# Altium footprint library PCB.PcbLib: 42 footprints (part 2 of 3)
Each footprint in its own frame and in the unit in brackets; x right, y up, seen from the top. Pads: shape width x height; smd on the part's side, far side on the other; paste and mask are expansions set on the pad; w line width, h text height; cw(c..) or ccw(c..) is an arc to the next point about the centre after c.
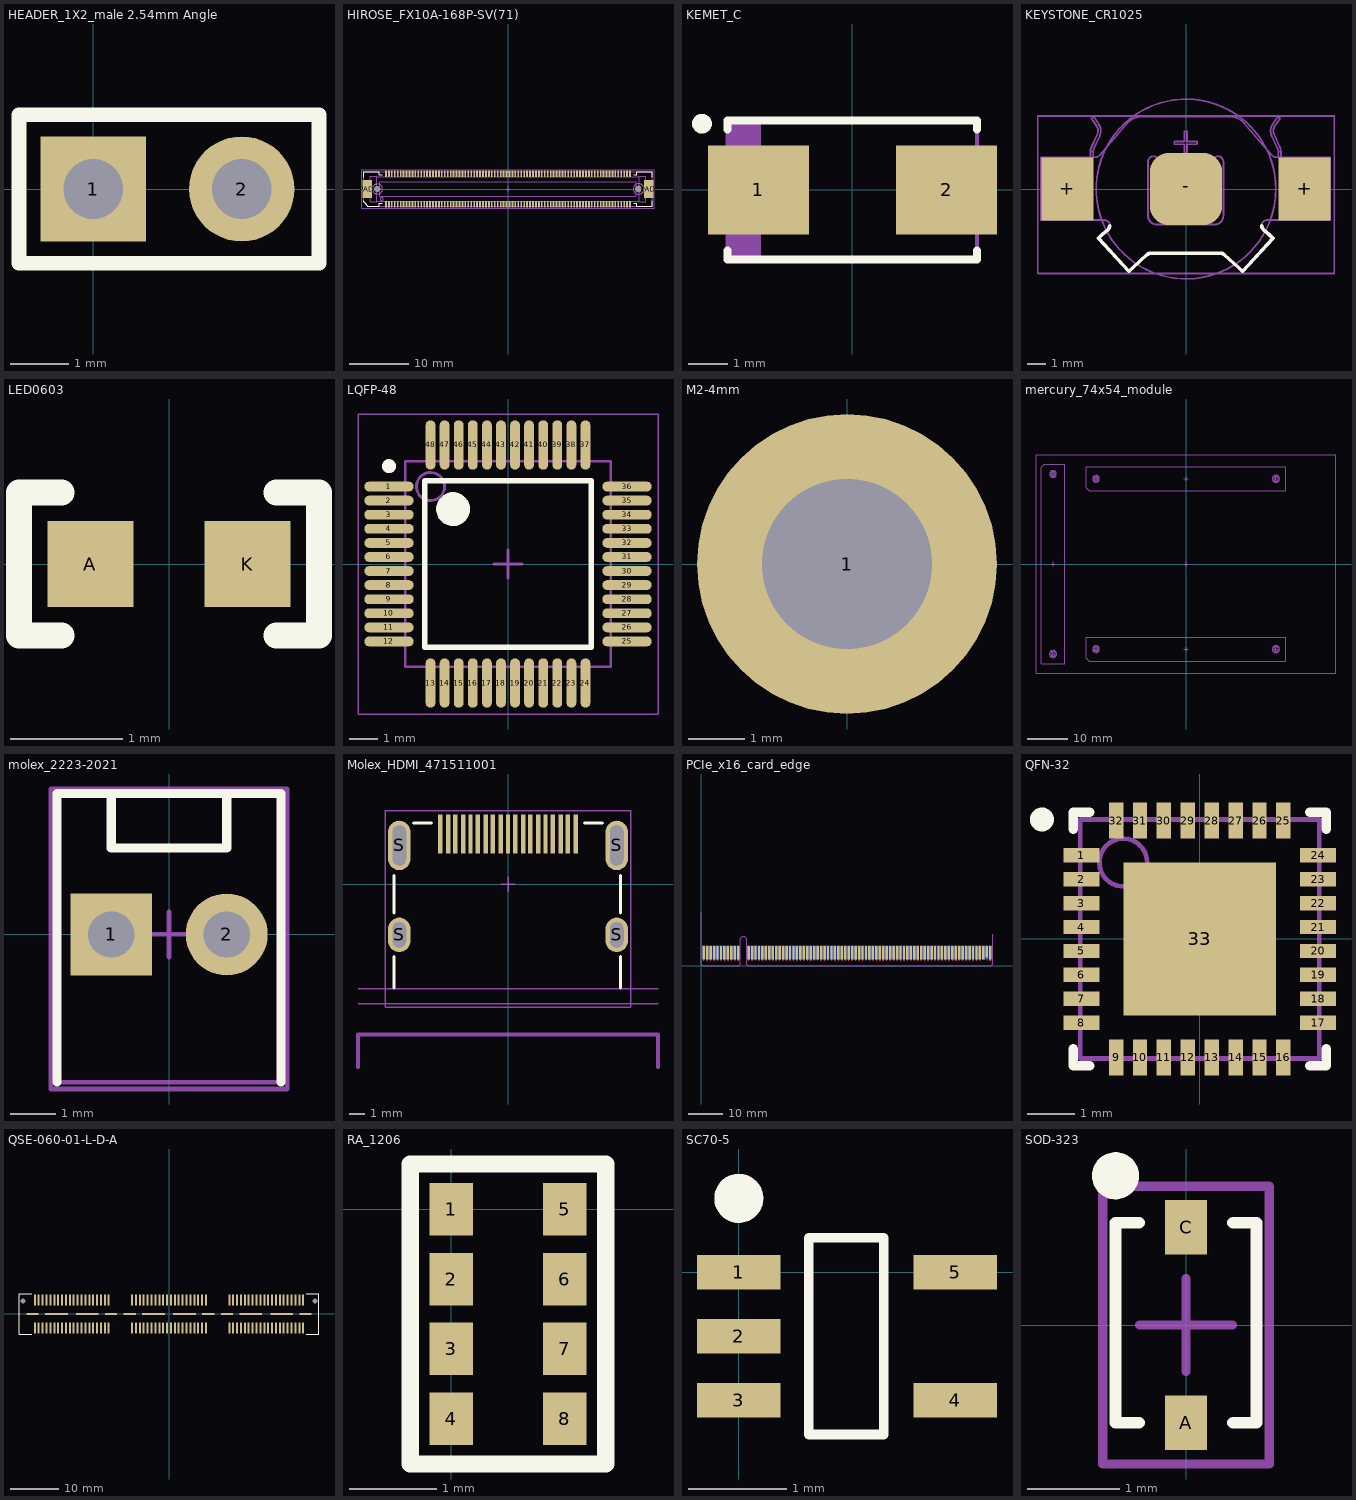
[diagram p1: the footprints below, top view; thin cyan lines are the x and y axes]

## HEADER_1X2_male 2.54mm Angle [mm] "Pinhead male 1x2 pitch 2.54mm angle"
pads (2):
  rect 1.8x1.8 hole 1.02: 1(0,0)
  round 1.8 hole 1.02: 2(2.54,0)
Top Overlay:
  lines w0.254: -1.27,-1.27 3.86,-1.27 3.86,1.27 -1.27,1.27 -1.27,-1.27
3D body: height 2.13, standoff -2.77, extent -1.17,-0.32 3.71,10.82

## HIROSE_FX10A-168P-SV(71) [mm] "Mercury FPGA baseboard header - 168pins - 4mm mating height"
height 4
pads (172):
  rect 0.3x1.1 smd: 1(-20.75,-2.6)
  rrect50% 0.3x1.1 smd: 2(-20.75,2.6) 3(-20.25,-2.6) 4(-20.25,2.6) 5(-19.75,-2.6) 6(-19.75,2.6) 7(-19.25,-2.6) 8(-19.25,2.6) 9(-18.75,-2.6) 10(-18.75,2.6) 11(-18.25,-2.6) 12(-18.25,2.6) 13(-17.75,-2.6) 14(-17.75,2.6) 15(-17.25,-2.6) 16(-17.25,2.6) 17(-16.75,-2.6) 18(-16.75,2.6) 19(-16.25,-2.6) 20(-16.25,2.6) 21(-15.75,-2.6) 22(-15.75,2.6) 23(-15.25,-2.6) 24(-15.25,2.6) 25(-14.75,-2.6) 26(-14.75,2.6) 27(-14.25,-2.6) 28(-14.25,2.6) 29(-13.75,-2.6) 30(-13.75,2.6) 31(-13.25,-2.6) 32(-13.25,2.6) 33(-12.75,-2.6) 34(-12.75,2.6) 35(-12.25,-2.6) 36(-12.25,2.6) 37(-11.75,-2.6) 38(-11.75,2.6) 39(-11.25,-2.6) 40(-11.25,2.6) 41(-10.75,-2.6) 42(-10.75,2.6) 43(-10.25,-2.6) 44(-10.25,2.6) 45(-9.75,-2.6) 46(-9.75,2.6) 47(-9.25,-2.6) 48(-9.25,2.6) 49(-8.75,-2.6) 50(-8.75,2.6) 51(-8.25,-2.6) 52(-8.25,2.6) 53(-7.75,-2.6) 54(-7.75,2.6) 55(-7.25,-2.6) 56(-7.25,2.6) 57(-6.75,-2.6) 58(-6.75,2.6) 59(-6.25,-2.6) 60(-6.25,2.6) 61(-5.75,-2.6) 62(-5.75,2.6) 63(-5.25,-2.6) 64(-5.25,2.6) 65(-4.75,-2.6) 66(-4.75,2.6) 67(-4.25,-2.6) 68(-4.25,2.6) 69(-3.75,-2.6) 70(-3.75,2.6) 71(-3.25,-2.6) 72(-3.25,2.6) 73(-2.75,-2.6) 74(-2.75,2.6) 75(-2.25,-2.6) 76(-2.25,2.6) 77(-1.75,-2.6) 78(-1.75,2.6) 79(-1.25,-2.6) 80(-1.25,2.6) 81(-0.75,-2.6) 82(-0.75,2.6) 83(-0.25,-2.6) 84(-0.25,2.6) 85(0.25,-2.6) 86(0.25,2.6) 87(0.75,-2.6) 88(0.75,2.6) 89(1.25,-2.6) 90(1.25,2.6) 91(1.75,-2.6) 92(1.75,2.6) 93(2.25,-2.6) 94(2.25,2.6) 95(2.75,-2.6) 96(2.75,2.6) 97(3.25,-2.6) 98(3.25,2.6) 99(3.75,-2.6) 100(3.75,2.6) 101(4.25,-2.6) 102(4.25,2.6) 103(4.75,-2.6) 104(4.75,2.6) 105(5.25,-2.6) 106(5.25,2.6) 107(5.75,-2.6) 108(5.75,2.6) 109(6.25,-2.6) 110(6.25,2.6) 111(6.75,-2.6) 112(6.75,2.6) 113(7.25,-2.6) 114(7.25,2.6) 115(7.75,-2.6) 116(7.75,2.6) 117(8.25,-2.6) 118(8.25,2.6) 119(8.75,-2.6) 120(8.75,2.6) 121(9.25,-2.6) 122(9.25,2.6) 123(9.75,-2.6) 124(9.75,2.6) 125(10.25,-2.6) 126(10.25,2.6) 127(10.75,-2.6) 128(10.75,2.6) 129(11.25,-2.6) 130(11.25,2.6) 131(11.75,-2.6) 132(11.75,2.6) 133(12.25,-2.6) 134(12.25,2.6) 135(12.75,-2.6) 136(12.75,2.6) 137(13.25,-2.6) 138(13.25,2.6) 139(13.75,-2.6) 140(13.75,2.6) 141(14.25,-2.6) 142(14.25,2.6) 143(14.75,-2.6) 144(14.75,2.6) 145(15.25,-2.6) 146(15.25,2.6) 147(15.75,-2.6) 148(15.75,2.6) 149(16.25,-2.6) 150(16.25,2.6) 151(16.75,-2.6) 152(16.75,2.6) 153(17.25,-2.6) 154(17.25,2.6) 155(17.75,-2.6) 156(17.75,2.6) 157(18.25,-2.6) 158(18.25,2.6) 159(18.75,-2.6) 160(18.75,2.6) 161(19.25,-2.6) 162(19.25,2.6) 163(19.75,-2.6) 164(19.75,2.6) 165(20.25,-2.6) 166(20.25,2.6) 167(20.75,-2.6) 168(20.75,2.6)
  round 0 hole 1.1 unplated: MTH(-22.2,0)
  round 0 hole 1.2 unplated: MTH(22.2,0)
  rect 1.6x3.1 smd: PAD(-23.95,0) PAD(23.95,0)
Top Overlay:
  lines w0.1: -21.35,-2.4 -21.9,-2.4 -21.9,-2.95 ; -21.35,2.4 -21.9,2.4 -21.9,2.95 -24.55,2.95 -24.55,2 ; 21.35,-2.4 21.9,-2.4 21.9,-2.95 ; 21.35,2.4 21.9,2.4 ; -24.55,-2 -24.55,-2.207 -23.807,-2.95 -21.9,-2.95 ; -24.55,-2 -24.55,-2 ; -24.55,2 -24.55,2 ; -21.9,-2.95 -21.9,-2.95 ; 21.9,-2.95 21.9,-2.95 ; 21.9,-2.95 24.55,-2.95 24.55,-2 ; 21.9,2.4 21.9,2.4 ; 21.9,2.4 21.9,2.95 ; 21.9,2.95 21.9,2.95 ; 21.9,2.95 24.55,2.95 24.55,2 ; 24.55,-2 24.55,-2 ; 24.55,2 24.55,2
Keep-Out Layer:
  circle w0.01: c-22.2,0 r0.85
  circle w0.01: c22.2,0 r0.9
Mechanical 12:
  circle w0.1: c-21.486,-1.7 r0.26
  circle w0.1: c-22.2,0 r0.85
  circle w0.1: c22.2,0 r0.9
  lines w0.05: -0.5,0 0.5,0 ; 0,-0.5 0,0.5
  lines w0.1: -22.3,-2.1 22.3,-2.1 ; -22.3,2.1 22.3,2.1 ; 24.55,-2.95 24.55,-2.95 ; 24.55,-2.95 -23.807,-2.95 -24.55,-2.207 -24.55,2.95 24.55,2.95 ; 24.55,-2.95 24.55,2.95 ; 24.55,2.95 24.55,2.95 ; -23.437,-2.187 -23.437,2.15 -22.3,2.15 -22.3,-2.187 -23.437,-2.187 ; -21.8,-1.26 21.8,-1.26 21.8,1.26 -21.8,1.26 -21.8,-1.26 ; 22.3,-2.15 23.42,-2.15 23.42,2.171 22.3,2.171 22.3,-2.15
  text ".Designator" at 1,0 h0.76
Mechanical 15:
  lines w0.02: -24.9,-3.3 -24.9,3.3 24.9,3.3 24.9,-3.3 -24.9,-3.3
3D body: height 3.51, standoff -0.59, extent -24.55,-2.95 24.55,2.95

## KEMET_C [mm] "Kemet type C package"
height 2.8
pads (2):
  rect 2.55x2.25 smd: 1(-2.375,0) 2(2.375,0)
Top Overlay:
  circle w0.25: c-3.8,1.675 r0.125
  lines w0.2: -3.15,-1.525 -3.15,-1.75 3.15,-1.75 3.15,-1.525 ; -3.15,1.525 -3.15,1.75 3.15,1.75 3.15,1.525
Mechanical 3:
  rectangle: -3.15,-1.75 -2.303,1.75
  lines w0.1: -3.15,-1.75 3.15,-1.75 3.15,1.75 -3.15,1.75 -3.15,-1.75
3D body: height 2.85, standoff 0, extent -3.023,-1.626 -2.286,1.651
3D body: height 2.8, standoff 0, extent -3.15,-1.75 3.15,1.75

## KEYSTONE_CR1025 [mm]
pads (3):
  rect 2.9x3.5 smd: +(-6.6,0) +(6.6,0)
  rrect50% 4x4 smd: -(0,0)
Top Overlay:
  lines w0.2: -4.246,-2.056 -4.248,-2.069 -4.251,-2.083 -4.255,-2.096 -4.259,-2.109 -4.263,-2.122 -4.268,-2.135 -4.273,-2.149 -4.279,-2.162 -4.284,-2.175 -4.289,-2.188 -4.337,-2.251 -4.655,-2.537 -4.877,-2.744 -3.189,-4.585 -2.961,-4.384 -2.178,-3.659 -2.115,-3.617 -2.046,-3.59 -1.972,-3.58 1.939,-3.58 2.013,-3.59 2.082,-3.617 2.14,-3.659 2.928,-4.384 3.156,-4.585 4.844,-2.744 4.622,-2.537 4.304,-2.251 4.257,-2.188 4.251,-2.175 4.245,-2.162 4.24,-2.149 4.235,-2.135 4.23,-2.122 4.225,-2.109 4.221,-2.096 4.217,-2.082 4.214,-2.069 4.211,-2.056
Mechanical 13:
  drawing of 624 lines, arcs and shapes, not listed
Mechanical 15:
  lines w0.1: -0.5,0 0.5,0 ; 0,-0.5 0,0.5 ; -8.255,-4.699 -8.255,4.064 -8.128,4.064 8.255,4.064 8.255,-4.699 -8.255,-4.699
Mechanical 16:
  circle w0.1: c0,0 r5
Mechanical 17:
  text "Battery insert" at -6.5,6 h1
3D body: height 2.95, standoff 0, extent -8.052,-4.608 8.053,4

## LED0603 [mil]
pads (2):
  rect 30x30 smd: A(-27.5,0) K(27.5,0)
Top Overlay:
  lines w9: -37.5,-25 -52.5,-25 -52.5,25 -37.5,25 ; 37.5,-25 52.5,-25 52.5,25 37.5,25
3D body: height 43.31, standoff 0, extent -32.81,-15.75 30.97,15.75

## LQFP-48 [mm] "LQFP-48, 48-Leads, Body 7.25x7.25mm, Pitch 0.50mm, IPC Medium Density"
height 1.6
pads (48):
  oval 1.75x0.35 smd: 1(-4.225,2.75) 2(-4.225,2.25) 3(-4.225,1.75) 4(-4.225,1.25) 5(-4.225,0.75) 6(-4.225,0.25) 7(-4.225,-0.25) 8(-4.225,-0.75) 9(-4.225,-1.25) 10(-4.225,-1.75) 11(-4.225,-2.25) 12(-4.225,-2.75) 25(4.225,-2.75) 26(4.225,-2.25) 27(4.225,-1.75) 28(4.225,-1.25) 29(4.225,-0.75) 30(4.225,-0.25) 31(4.225,0.25) 32(4.225,0.75) 33(4.225,1.25) 34(4.225,1.75) 35(4.225,2.25) 36(4.225,2.75)
  oval 0.35x1.75 smd: 13(-2.75,-4.225) 14(-2.25,-4.225) 15(-1.75,-4.225) 16(-1.25,-4.225) 17(-0.75,-4.225) 18(-0.25,-4.225) 19(0.25,-4.225) 20(0.75,-4.225) 21(1.25,-4.225) 22(1.75,-4.225) 23(2.25,-4.225) 24(2.75,-4.225) 37(2.75,4.225) 38(2.25,4.225) 39(1.75,4.225) 40(1.25,4.225) 41(0.75,4.225) 42(0.25,4.225) 43(-0.25,4.225) 44(-0.75,4.225) 45(-1.25,4.225) 46(-1.75,4.225) 47(-2.25,4.225) 48(-2.75,4.225)
Top Overlay:
  circle w0.25: c-4.225,3.475 r0.125
  circle w0.6: c-1.95,1.95 r0.3
  lines w0.2: -2.95,-2.95 -2.95,2.95 2.95,2.95 2.95,-2.95 -2.95,-2.95
Mechanical 13:
  circle w0.1: c-2.75,2.75 r0.5
  lines w0.1: -3.65,-3.65 -3.65,3.65 3.65,3.65 3.65,-3.65 -3.65,-3.65
Mechanical 15:
  lines w0.05: -5.325,-5.325 -5.325,5.325 5.325,5.325 5.325,-5.325 -5.325,-5.325
  lines w0.1: -0.5,0 0.5,0 ; 0,-0.5 0,0.5
3D body: height 1.6, standoff 0.15, extent -3.65,-3.65 3.65,3.65

## M2-4mm [mm] "SMT Steel Spacer, M2 Thread Internal, 4mm"
height 4
pads (1):
  round 5.3 / inner round 0 / far side round 0 hole 3 paste-403.566: 1(0,0)
Top Paste:
  drawing of 4 lines, arcs and shapes, not listed
Mechanical 13:
  circle w0.12: c0,0 r2.175
3D body: height 4, standoff -1.4, extent -2.175,-2.171 2.158,2.171

## mercury_74x54_module [mm] "For module of 74 x 54 mm"
Mechanical 12:
  text ".Designator" at 0,-1 h0.76
Mechanical 13:
  circle w0.1: c-22.2,21 r0.85
  circle w0.1: c-32.8,22.2 r0.85
  circle w0.1: c-32.8,-22.2 r0.9
  circle w0.1: c22.2,-21 r0.6
  circle w0.1: c-22.2,-21 r0.55
  circle w0.1: c22.2,21 r0.6
  circle w0.1: c22.2,-21 r0.9
  circle w0.1: c-22.2,21 r0.55
  circle w0.1: c22.2,21 r0.9
  circle w0.1: c-32.8,22.2 r0.55
  circle w0.1: c-32.8,-22.2 r0.6
  circle w0.1: c-22.2,-21 r0.85
  lines w0.1: -33.4,-22.2 -32.2,-22.2 ; -33.35,22.2 -32.25,22.2 ; -32.8,-22.8 -32.8,-21.6 ; -32.8,21.65 -32.8,22.75 ; -22.75,-21 -21.65,-21 ; -22.75,21 -21.65,21 ; -22.2,-21.55 -22.2,-20.45 ; -22.2,20.45 -22.2,21.55 ; 21.6,-21 22.8,-21 ; 21.6,21 22.8,21 ; 22.2,-21.6 22.2,-20.4 ; 22.2,20.4 22.2,21.6 ; -37,-27 37,-27 37,27 -37,27 -37,-27 ; -35.75,-24.55 -35.75,23.807 -35.007,24.55 -29.85,24.55 -29.85,-24.55 -35.75,-24.55 ; -24.55,-23.207 -24.55,-18.05 24.55,-18.05 24.55,-23.95 -23.807,-23.95 -24.55,-23.207 ; -24.55,18.793 -24.55,23.95 24.55,23.95 24.55,18.05 -23.807,18.05 -24.55,18.793
  lines w0.15: -33.3,0 -32.3,0 ; -32.8,-0.5 -32.8,0.5 ; -0.5,-21 0.5,-21 ; -0.5,0 0.5,0 ; -0.5,21 0.5,21 ; 0,-21.5 0,-20.5 ; 0,-0.5 0,0.5 ; 0,20.5 0,21.5
  text "B" at 17.578,20.492 h0.76
  text "B" at 12.128,20.492 h0.76
  text "B" at 6.678,20.492 h0.76
  text "B" at -4.422,20.492 h0.76
  text "B" at -10.072,20.492 h0.76
  text "B" at -15.722,20.492 h0.76
  text "A" at 17.578,-21.508 h0.76
  text "A" at 12.128,-21.508 h0.76
  text "A" at 6.678,-21.508 h0.76
  text "A" at -4.422,-21.508 h0.76
  text "A" at -10.072,-21.508 h0.76
  text "A" at -15.722,-21.508 h0.76
  text "C" at -33.308,15.722 h0.76
  text "C" at -33.308,10.072 h0.76
  text "C" at -33.308,4.422 h0.76
  text "C" at -33.308,-6.678 h0.76
  text "C" at -33.308,-12.128 h0.76
  text "C" at -33.308,-17.578 h0.76
3D body: height 1.5, standoff 1.5, extent -37,-27 37,27

## molex_2223-2021 [mm] "Pinhead male 1x2 pitch 2.54mm straight"
pads (2):
  rect 1.8x1.8 hole 1.02: 1(-1.27,0)
  round 1.8 hole 1.02: 2(1.27,0)
Top Overlay:
  lines w0.2: -2.465,-3.25 -2.465,3.1 2.465,3.1 2.465,-3.25 ; -1.27,3.1 -1.27,1.905 1.27,1.905 1.27,3.1
Mechanical 13:
  lines w0.1: -1.27,3.1 -1.27,1.905 1.27,1.905 1.27,3.1 ; -2.465,-3.25 -2.465,3.1 2.465,3.1 2.465,-3.25 -2.465,-3.25
Mechanical 15:
  lines w0.1: -0.5,0 0.5,0 ; 0,-0.5 0,0.5 ; -2.6,-3.4 2.6,-3.4 2.6,3.2 -2.6,3.2 -2.6,-3.4
3D body: height 10.68, standoff -3.54, extent -2.489,-3.2 2.439,3.15

## Molex_HDMI_471511001 [mm] "HEADER, RIGHT ANGLE, HDMI"
height 5
pads (23):
  rect 0.3x2.6 smd: 1(4.5,3.36) 2(4,3.36) 3(3.5,3.36) 4(3,3.36) 5(2.5,3.36) 6(2,3.36) 7(1.5,3.36) 8(1,3.36) 9(0.5,3.36) 10(0,3.36) 11(-0.5,3.36) 12(-1,3.36) 13(-1.5,3.36) 14(-2,3.36) 15(-2.5,3.36) 16(-3,3.36) 17(-3.5,3.36) 18(-4,3.36) 19(-4.5,3.36)
  oval 1.5x2.3 hole 0.9 slot 1.7 at 90 deg: S(-7.25,-3.36) S(7.25,-3.36)
  oval 1.5x3.3 hole 0.9 slot 2.7 at 90 deg: S(-7.25,2.6) S(7.25,2.6)
Top Overlay:
  lines w0.2: -7.6,-6.9 -7.6,-4.8 ; -7.6,-1.9 -7.6,0.6 ; -6.3,4.1 -5.1,4.1 ; 5.1,4.1 6.3,4.1 ; 7.5,-6.9 7.5,-4.8 ; 7.5,-1.9 7.5,0.6
Mechanical 3:
  lines w0.254: -10,-12.175 -10,-10 10,-10 10,-12.175
  text "Typical plug (20mm)" at -7.05,-11.4 h0.76
Mechanical 15:
  lines w0.1: -0.5,0 0.5,0 ; 0,-0.5 0,0.5 ; -8.2,-8.2 -8.2,2.7 -8.2,4.9 8.2,4.9 8.2,-8.2 -8.2,-8.2
Mechanical 16:
  lines w0.1: -10,-7.95 10,-7.95 ; -10,-6.95 10,-6.95
Mechanical 17:
  text "Panel wall (front face)" at -7.85,-9.2 h0.76
  text "PCB Edge" at -2.75,-6.2 h0.76
3D body: height 6.28, standoff -2.1, extent -7.55,-8.075 7.45,4.075

## PCIe_x16_card_edge [mm]
height 0.35
pads (164):
  rect 0.7x3.4 smd far side paste-10 mask-10: A1(0.65,4.1)
  rect 0.7x3.9 smd far side paste-10 mask-10: A2(1.65,3.85) A3(2.65,3.85) A4(3.65,3.85) A5(4.65,3.85) A6(5.65,3.85) A7(6.65,3.85) A8(7.65,3.85) A9(8.65,3.85) A10(9.65,3.85) A11(10.65,3.85) A12(13.65,3.85) A13(14.65,3.85) A14(15.65,3.85) A15(16.65,3.85) A16(17.65,3.85) A17(18.65,3.85) A18(19.65,3.85) A19(20.65,3.85) A20(21.65,3.85) A21(22.65,3.85) A22(23.65,3.85) A23(24.65,3.85) A24(25.65,3.85) A25(26.65,3.85) A26(27.65,3.85) A27(28.65,3.85) A28(29.65,3.85) A29(30.65,3.85) A30(31.65,3.85) A31(32.65,3.85) A32(33.65,3.85) A33(34.65,3.85) A34(35.65,3.85) A35(36.65,3.85) A36(37.65,3.85) A37(38.65,3.85) A38(39.65,3.85) A39(40.65,3.85) A40(41.65,3.85) A41(42.65,3.85) A42(43.65,3.85) A43(44.65,3.85) A44(45.65,3.85) A45(46.65,3.85) A46(47.65,3.85) A47(48.65,3.85) A48(49.65,3.85) A49(50.65,3.85) A50(51.65,3.85) A51(52.65,3.85) A52(53.65,3.85) A53(54.65,3.85) A54(55.65,3.85) A55(56.65,3.85) A56(57.65,3.85) A57(58.65,3.85) A58(59.65,3.85) A59(60.65,3.85) A60(61.65,3.85) A61(62.65,3.85) A62(63.65,3.85) A63(64.65,3.85) A64(65.65,3.85) A65(66.65,3.85) A66(67.65,3.85) A67(68.65,3.85) A68(69.65,3.85) A69(70.65,3.85) A70(71.65,3.85) A71(72.65,3.85) A72(73.65,3.85) A73(74.65,3.85) A74(75.65,3.85) A75(76.65,3.85) A76(77.65,3.85) A77(78.65,3.85) A78(79.65,3.85) A79(80.65,3.85) A80(81.65,3.85) A81(82.65,3.85) A82(83.65,3.85)
  rect 0.7x3.9 smd paste-10 mask-10: B1(0.65,3.85) B2(1.65,3.85) B3(2.65,3.85) B4(3.65,3.85) B5(4.65,3.85) B6(5.65,3.85) B7(6.65,3.85) B8(7.65,3.85) B9(8.65,3.85) B10(9.65,3.85) B11(10.65,3.85) B12(13.65,3.85) B13(14.65,3.85) B14(15.65,3.85) B15(16.65,3.85) B16(17.65,3.85) B17(18.65,3.85) B18(19.65,3.85) B19(20.65,3.85) B20(21.65,3.85) B21(22.65,3.85) B22(23.65,3.85) B23(24.65,3.85) B24(25.65,3.85) B25(26.65,3.85) B26(27.65,3.85) B27(28.65,3.85) B28(29.65,3.85) B29(30.65,3.85) B30(31.65,3.85) B31(32.65,3.85) B32(33.65,3.85) B33(34.65,3.85) B34(35.65,3.85) B35(36.65,3.85) B36(37.65,3.85) B37(38.65,3.85) B38(39.65,3.85) B39(40.65,3.85) B40(41.65,3.85) B41(42.65,3.85) B42(43.65,3.85) B43(44.65,3.85) B44(45.65,3.85) B45(46.65,3.85) B46(47.65,3.85) B47(48.65,3.85) B48(49.65,3.85) B49(50.65,3.85) B50(51.65,3.85) B51(52.65,3.85) B52(53.65,3.85) B53(54.65,3.85) B54(55.65,3.85) B55(56.65,3.85) B56(57.65,3.85) B57(58.65,3.85) B58(59.65,3.85) B59(60.65,3.85) B60(61.65,3.85) B61(62.65,3.85) B62(63.65,3.85) B63(64.65,3.85) B64(65.65,3.85) B65(66.65,3.85) B66(67.65,3.85) B67(68.65,3.85) B68(69.65,3.85) B69(70.65,3.85) B70(71.65,3.85) B71(72.65,3.85) B72(73.65,3.85) B73(74.65,3.85) B74(75.65,3.85) B75(76.65,3.85) B76(77.65,3.85) B77(78.65,3.85) B78(79.65,3.85) B79(80.65,3.85) B80(81.65,3.85) B82(83.65,3.85)
  rect 0.7x3.4 smd paste-10 mask-10: B81(82.65,4.1)
Top Layer:
  rectangle: 83.499,1.4 83.799,2.625
  rectangle: 80.499,1.4 80.799,2.625
  rectangle: 79.499,1.4 79.799,2.625
  rectangle: 78.499,1.4 78.799,2.625
  rectangle: 77.499,1.4 77.799,2.625
  rectangle: 76.499,1.4 76.799,2.625
  rectangle: 75.499,1.4 75.799,2.625
  rectangle: 74.499,1.4 74.799,2.625
  rectangle: 73.499,1.4 73.799,2.625
  rectangle: 72.499,1.4 72.799,2.625
  rectangle: 71.499,1.4 71.799,2.625
  rectangle: 70.499,1.4 70.799,2.625
  rectangle: 69.499,1.4 69.799,2.625
  rectangle: 68.499,1.4 68.799,2.625
  rectangle: 67.499,1.4 67.799,2.625
  rectangle: 66.499,1.4 66.799,2.625
  rectangle: 65.499,1.4 65.799,2.625
  rectangle: 64.499,1.4 64.799,2.625
  rectangle: 63.499,1.4 63.799,2.625
  rectangle: 62.499,1.4 62.799,2.625
  rectangle: 61.499,1.4 61.799,2.625
  rectangle: 60.499,1.4 60.799,2.625
  rectangle: 59.499,1.4 59.799,2.625
  rectangle: 58.499,1.4 58.799,2.625
  rectangle: 57.499,1.4 57.799,2.625
  rectangle: 56.499,1.4 56.799,2.625
  rectangle: 55.499,1.4 55.799,2.625
  rectangle: 54.499,1.4 54.799,2.625
  rectangle: 53.499,1.4 53.799,2.625
  rectangle: 52.499,1.4 52.799,2.625
  rectangle: 51.499,1.4 51.799,2.625
  rectangle: 50.499,1.4 50.799,2.625
  rectangle: 48.499,1.4 48.799,2.625
  rectangle: 46.499,1.4 46.799,2.625
  rectangle: 45.499,1.4 45.799,2.625
  rectangle: 44.499,1.4 44.799,2.625
  rectangle: 43.499,1.4 43.799,2.625
  rectangle: 42.5,1.401 42.8,2.626
  rectangle: 41.499,1.4 41.799,2.625
  rectangle: 40.5,1.401 40.8,2.626
  rectangle: 39.5,1.401 39.8,2.626
  rectangle: 38.499,1.4 38.799,2.625
  rectangle: 35.499,1.4 35.799,2.625
  rectangle: 34.5,1.401 34.8,2.626
  rectangle: 31.499,1.4 31.799,2.625
  rectangle: 30.499,1.4 30.799,2.625
  rectangle: 29.5,1.401 29.8,2.626
  rectangle: 28.499,1.4 28.799,2.625
  rectangle: 27.5,1.401 27.8,2.626
  rectangle: 26.499,1.4 26.799,2.625
  rectangle: 25.499,1.4 25.799,2.625
  rectangle: 24.5,1.401 24.8,2.626
  rectangle: 23.499,1.4 23.799,2.625
  rectangle: 22.5,1.401 22.8,2.626
  rectangle: 21.499,1.4 21.799,2.625
  rectangle: 20.499,1.4 20.799,2.625
  rectangle: 19.5,1.401 19.8,2.626
  rectangle: 17.499,1.4 17.799,2.625
  rectangle: 16.499,1.4 16.799,2.625
  rectangle: 14.5,1.401 14.8,2.626
  rectangle: 13.499,1.4 13.799,2.625
  rectangle: 10.499,1.4 10.799,2.625
  rectangle: 9.5,1.401 9.8,2.626
  rectangle: 8.499,1.4 8.799,2.625
  rectangle: 7.499,1.4 7.799,2.625
  rectangle: 6.5,1.401 6.8,2.626
  rectangle: 5.499,1.4 5.799,2.625
  rectangle: 4.5,1.401 4.8,2.626
  rectangle: 3.499,1.4 3.799,2.625
  rectangle: 2.499,1.4 2.799,2.625
  rectangle: 1.5,1.401 1.8,2.626
  rectangle: 0.499,1.4 0.799,2.625
  rectangle: 49.5,1.401 49.8,2.626
  rectangle: 18.499,1.4 18.799,2.625
Bottom Layer:
  rectangle: 83.499,1.4 83.799,2.625
  rectangle: 82.499,1.4 82.799,2.625
  rectangle: 79.499,1.4 79.799,2.625
  rectangle: 78.499,1.4 78.799,2.625
  rectangle: 77.499,1.4 77.799,2.625
  rectangle: 76.499,1.4 76.799,2.625
  rectangle: 75.499,1.4 75.799,2.625
  rectangle: 74.499,1.4 74.799,2.625
  rectangle: 73.499,1.4 73.799,2.625
  rectangle: 72.499,1.4 72.799,2.625
  rectangle: 71.499,1.4 71.799,2.625
  rectangle: 70.499,1.4 70.799,2.625
  rectangle: 69.499,1.4 69.799,2.625
  rectangle: 68.499,1.4 68.799,2.625
  rectangle: 67.499,1.4 67.799,2.625
  rectangle: 66.499,1.4 66.799,2.625
  rectangle: 65.499,1.4 65.799,2.625
  rectangle: 64.499,1.4 64.799,2.625
  rectangle: 63.499,1.4 63.799,2.625
  rectangle: 62.499,1.4 62.799,2.625
  rectangle: 61.499,1.4 61.799,2.625
  rectangle: 60.499,1.4 60.799,2.625
  rectangle: 59.499,1.4 59.799,2.625
  rectangle: 58.499,1.4 58.799,2.625
  rectangle: 57.499,1.4 57.799,2.625
  rectangle: 56.499,1.4 56.799,2.625
  rectangle: 55.499,1.4 55.799,2.625
  rectangle: 54.499,1.4 54.799,2.625
  rectangle: 53.499,1.4 53.799,2.625
  rectangle: 52.499,1.4 52.799,2.625
  rectangle: 51.499,1.4 51.799,2.625
  rectangle: 50.499,1.4 50.799,2.625
  rectangle: 49.499,1.4 49.799,2.625
  rectangle: 48.499,1.4 48.799,2.625
  rectangle: 47.499,1.4 47.799,2.625
  rectangle: 45.499,1.4 45.799,2.625
  rectangle: 44.499,1.4 44.799,2.625
  rectangle: 43.499,1.4 43.799,2.625
  rectangle: 42.5,1.401 42.8,2.626
  rectangle: 41.499,1.4 41.799,2.625
  rectangle: 40.5,1.401 40.8,2.626
  rectangle: 39.5,1.401 39.8,2.626
  rectangle: 38.499,1.4 38.799,2.625
  rectangle: 37.5,1.401 37.8,2.626
  rectangle: 36.499,1.4 36.799,2.625
  rectangle: 35.499,1.4 35.799,2.625
  rectangle: 34.5,1.401 34.8,2.626
  rectangle: 33.499,1.4 33.799,2.625
  rectangle: 32.5,1.401 32.8,2.626
  rectangle: 31.499,1.4 31.799,2.625
  rectangle: 30.499,1.4 30.799,2.625
  rectangle: 29.5,1.401 29.8,2.626
  rectangle: 28.499,1.4 28.799,2.625
  rectangle: 27.5,1.401 27.8,2.626
  rectangle: 26.499,1.4 26.799,2.625
  rectangle: 25.499,1.4 25.799,2.625
  rectangle: 24.5,1.401 24.8,2.626
  rectangle: 23.499,1.4 23.799,2.625
  rectangle: 22.5,1.401 22.8,2.626
  rectangle: 21.499,1.4 21.799,2.625
  rectangle: 20.499,1.4 20.799,2.625
  rectangle: 19.5,1.401 19.8,2.626
  rectangle: 18.499,1.4 18.799,2.625
  rectangle: 17.499,1.4 17.799,2.625
  rectangle: 16.499,1.4 16.799,2.625
  rectangle: 15.499,1.4 15.799,2.625
  rectangle: 14.5,1.401 14.8,2.626
  rectangle: 13.499,1.4 13.799,2.625
  rectangle: 10.499,1.4 10.799,2.625
  rectangle: 9.5,1.401 9.8,2.626
  rectangle: 8.499,1.4 8.799,2.625
  rectangle: 7.499,1.4 7.799,2.625
  rectangle: 6.5,1.401 6.8,2.626
  rectangle: 5.499,1.4 5.799,2.625
  rectangle: 4.5,1.401 4.8,2.626
  rectangle: 3.499,1.4 3.799,2.625
  rectangle: 2.499,1.4 2.799,2.625
  rectangle: 1.5,1.401 1.8,2.626
Top Solder:
  region: 13.05,5.85 13.05,0.5 13.55,0 83.75,0 84.25,0.5 84.25,5.85
  region: 0,5.85 0,0.5 0.5,0 10.75,0 11.25,0.5 11.25,5.85
Bottom Solder:
  region: 13.05,5.85 13.05,0.5 13.55,0 83.75,0 84.25,0.5 84.25,5.85
  region: -0.025,5.85 -0.025,0.525 0.5,0 10.8,0 11.25,0.45 11.25,5.85
Mechanical 1:
  lines w0.1: 0,15.625 0,0.55 0.55,0 10.75,0 11.2,0.45 11.2,7.55 cw(c12.15,7.55) 13.1,7.55 13.1,0.475 13.575,0 83.75,0 84.3,0.55 84.3,9.15

## QFN-32 [mm] "QFN, 32-Leads, Body 5,00x5,00mm, Pitch 0,50mm, Thermal Pad 3,20x3,20mm, IPC Medium Density"
height 1
pads (33):
  rect 0.75x0.3 smd: 1(-2.475,1.75) 2(-2.475,1.25) 3(-2.475,0.75) 4(-2.475,0.25) 5(-2.475,-0.25) 6(-2.475,-0.75) 7(-2.475,-1.25) 8(-2.475,-1.75) 17(2.475,-1.75) 18(2.475,-1.25) 19(2.475,-0.75) 20(2.475,-0.25) 21(2.475,0.25) 22(2.475,0.75) 23(2.475,1.25) 24(2.475,1.75)
  rect 0.3x0.75 smd: 9(-1.75,-2.475) 10(-1.25,-2.475) 11(-0.75,-2.475) 12(-0.25,-2.475) 13(0.25,-2.475) 14(0.75,-2.475) 15(1.25,-2.475) 16(1.75,-2.475) 25(1.75,2.475) 26(1.25,2.475) 27(0.75,2.475) 28(0.25,2.475) 29(-0.25,2.475) 30(-0.75,2.475) 31(-1.25,2.475) 32(-1.75,2.475)
  rect 3.2x3.2 smd: 33(0,0)
Top Overlay:
  circle w0.25: c-3.3,2.5 r0.125
  lines w0.2: -2.65,-2.3 -2.65,-2.65 -2.3,-2.65 ; -2.65,2.3 -2.65,2.65 -2.3,2.65 ; 2.3,-2.65 2.65,-2.65 2.65,-2.3 ; 2.3,2.65 2.65,2.65 2.65,2.3
Mechanical 13:
  circle w0.1: c-1.6,1.6 r0.5
  lines w0.1: -2.5,-2.5 -2.5,2.5 2.5,2.5 2.5,-2.5 -2.5,-2.5
3D body: height 1, standoff 0.05, extent -2.5,-2.5 2.5,2.5
3D body: height 0.25, standoff 0, extent -2.5,-2.5 2.5,2.5

## QSE-060-01-L-D-A [mm]
height 0.35
pads (134):
  round 0 hole 1.02: 0(-30.063,2.66) 0(30.064,2.66)
  rect 0.41x2.27 smd: 1(-27.601,-2.865) 2(-27.601,2.865) 3(-26.801,-2.865) 4(-26.801,2.865) 5(-26.001,-2.865) 6(-26.001,2.865) 7(-25.201,-2.865) 8(-25.201,2.865) 9(-24.401,-2.865) 10(-24.401,2.865) 11(-23.601,-2.865) 12(-23.601,2.865) 13(-22.801,-2.865) 14(-22.801,2.865) 15(-22.001,-2.865) 16(-22.001,2.865) 17(-21.201,-2.865) 18(-21.201,2.865) 19(-20.401,-2.865) 20(-20.401,2.865) 21(-19.601,-2.865) 22(-19.601,2.865) 23(-18.801,-2.865) 24(-18.801,2.865) 25(-18.001,-2.865) 26(-18.001,2.865) 27(-17.201,-2.865) 28(-17.201,2.865) 29(-16.401,-2.865) 30(-16.401,2.865) 31(-15.601,-2.865) 32(-15.601,2.865) 33(-14.801,-2.865) 34(-14.801,2.865) 35(-14.001,-2.865) 36(-14.001,2.865) 37(-13.201,-2.865) 38(-13.201,2.865) 39(-12.401,-2.865) 40(-12.401,2.865) 41(-7.598,-2.865) 42(-7.598,2.865) 43(-6.798,-2.865) 44(-6.798,2.865) 45(-5.998,-2.865) 46(-5.998,2.865) 47(-5.198,-2.865) 48(-5.198,2.865) 49(-4.398,-2.865) 50(-4.398,2.865) 51(-3.598,-2.865) 52(-3.598,2.865) 53(-2.798,-2.865) 54(-2.798,2.865) 55(-1.998,-2.865) 56(-1.998,2.865) 57(-1.198,-2.865) 58(-1.198,2.865) 59(-0.398,-2.865) 60(-0.398,2.865) 61(0.402,-2.865) 62(0.402,2.865) 63(1.202,-2.865) 64(1.202,2.865) 65(2.002,-2.865) 66(2.002,2.865) 67(2.802,-2.865) 68(2.802,2.865) 69(3.602,-2.865) 70(3.602,2.865) 71(4.402,-2.865) 72(4.402,2.865) 73(5.202,-2.865) 74(5.202,2.865) 75(6.002,-2.865) 76(6.002,2.865) 77(6.802,-2.865) 78(6.802,2.865) 79(7.602,-2.865) 80(7.602,2.865) 81(12.402,-2.865) 82(12.402,2.865) 83(13.202,-2.865) 84(13.202,2.865) 85(14.002,-2.865) 86(14.002,2.865) 87(14.802,-2.865) 88(14.802,2.865) 89(15.602,-2.865) 90(15.602,2.865) 91(16.402,-2.865) 92(16.402,2.865) 93(17.202,-2.865) 94(17.202,2.865) 95(18.002,-2.865) 96(18.002,2.865) 97(18.802,-2.865) 98(18.802,2.865) 99(19.602,-2.865) 100(19.602,2.865) 101(20.402,-2.865) 102(20.402,2.865) 103(21.202,-2.865) 104(21.202,2.865) 105(22.002,-2.865) 106(22.002,2.865) 107(22.802,-2.865) 108(22.802,2.865) 109(23.602,-2.865) 110(23.602,2.865) 111(24.402,-2.865) 112(24.402,2.865) 113(25.202,-2.865) 114(25.202,2.865) 115(26.002,-2.865) 116(26.002,2.865) 117(26.802,-2.865) 118(26.802,2.865) 119(27.602,-2.865) 120(27.602,2.865)
  rect 2.54x0.43 smd: M1(-28.068,-0.007) M1(-11.941,-0.007) M2(-8.057,-0.006) M2(8.071,-0.006) M3(11.943,-0.006) M3(28.071,-0.006)
  rect 4.7x0.43 smd: M1(-23.176,-0.007) M1(-16.831,-0.006) M2(-3.166,-0.006) M2(3.18,-0.006) M3(16.833,-0.006) M3(23.179,-0.006)
Top Overlay:
  lines w0.254: -28.199,-4.205 -30.859,-4.205 -30.858,4.195 -28.199,4.195 ; 28.198,-4.205 30.858,-4.205 30.858,4.195 28.198,4.195
3D body: height 3.05, standoff -0.52, extent -30.679,-3.768 30.611,3.725

## RA_1206 [mm] "Resistor Array 0.8mm"
pads (8):
  rect 0.5x0.6 smd: 1(0,0) 2(0,-0.8) 3(0,-1.6) 4(0,-2.4) 5(1.3,0) 6(1.3,-0.8) 7(1.3,-1.6) 8(1.3,-2.4)
Top Overlay:
  lines w0.2: -0.47,-2.92 1.77,-2.92 1.77,0.52 -0.47,0.52 -0.47,-2.92
Mechanical 1:
  lines w0.05: -0.47,-2.92 1.77,-2.92 1.77,0.52 -0.47,0.52 -0.47,-2.92
Mechanical 2:
  lines w0.001: -0.47,-2.92 1.77,-2.92 1.77,0.52 -0.47,0.52 -0.47,-2.92
Mechanical 3:
  lines w0.1: -0.47,-2.92 1.77,-2.92 1.77,0.52 -0.47,0.52 -0.47,-2.92
3D body: height 0.55, standoff 0, extent -0.47,-2.92 1.77,0.52

## SC70-5 [mm] "SC70, 5-Leads, Pitch 0,65mm, EIAJ SC-88a"
height 1.1
pads (5):
  rect 0.85x0.35 smd: 1(0,0) 2(0,-0.65) 3(0,-1.3) 4(2.2,-1.3) 5(2.2,0)
Top Overlay:
  circle w0.25: c0,0.75 r0.125
  lines w0.1: 0.711,-1.65 0.711,0.35 1.473,0.35 1.473,-1.65 0.711,-1.65
3D body: height 0.96, standoff 0.01, extent 0.068,-1.635 2.168,0.365

## SOD-323 [mm]
pads (2):
  rect 0.45x0.59 smd: A(0,-1.055) C(0,1.055)
Top Overlay:
  circle w0.254: c-0.762,1.612 r0.127
  lines w0.127: -0.508,-1.055 -0.762,-1.055 -0.762,1.104 -0.508,1.104 ; 0.508,-1.055 0.762,-1.055 0.762,1.104 0.508,1.104
Mechanical 15:
  lines w0.1: -0.5,0 0.5,0 ; 0,-0.5 0,0.5 ; -0.9,-1.5 0.9,-1.5 0.9,1.5 0,1.5 -0.9,1.5 -0.9,-1.5
3D body: height 1, standoff 0.01, extent -0.625,-1.25 0.625,1.25